# Altium footprint library EG4S20BG256.PcbLib: 33 footprints (part 2 of 3)
Each footprint in its own frame and in the unit in brackets; x right, y up, seen from the top. Pads: shape width x height; smd on the part's side, far side on the other; paste and mask are expansions set on the pad; w line width, h text height; cw(c..) or ccw(c..) is an arc to the next point about the centre after c.
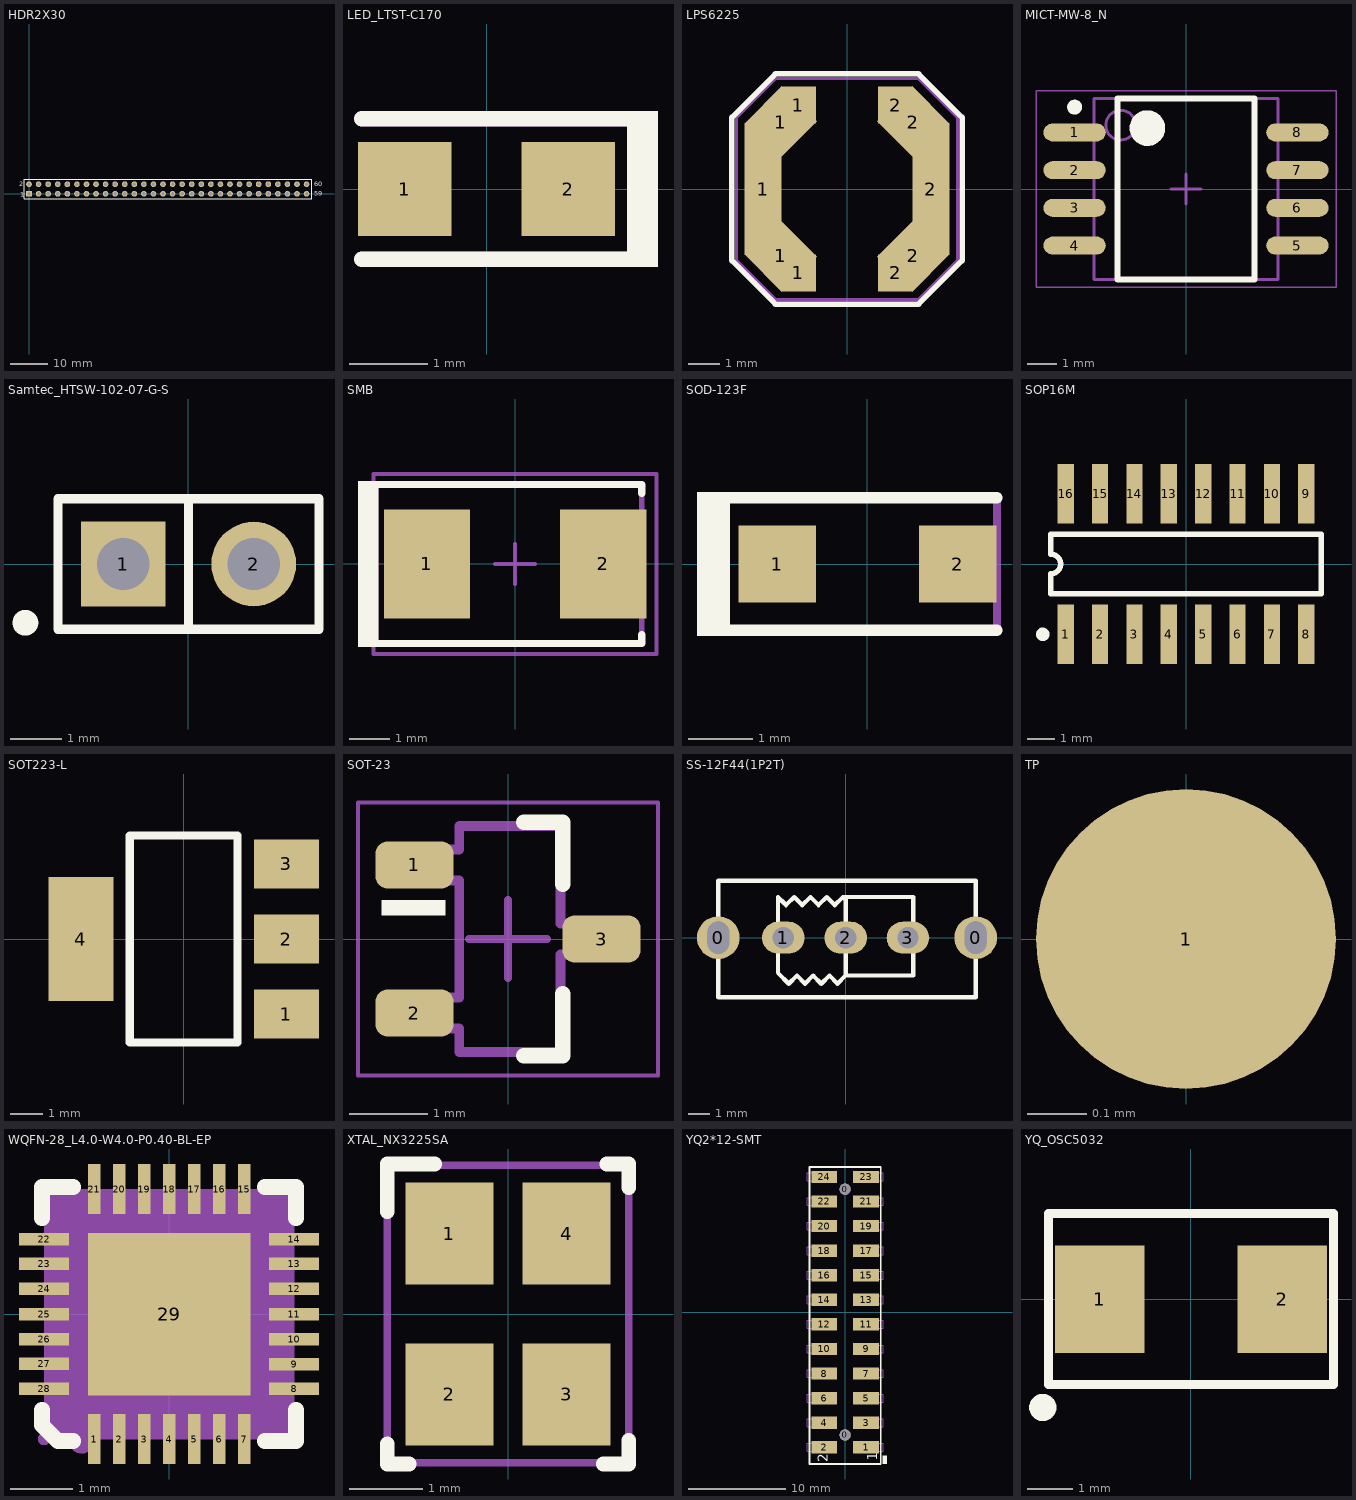
[diagram p1: the footprints below, top view; thin cyan lines are the x and y axes]

## HDR2X30 [mm] "Connector; Header; 30x2 Position"
height 5.563
pads (60):
  rect 1.5x1.5 hole 0.9: 1(0,0)
  round 1.5 hole 0.9: 2(0,2.54) 3(2.54,0) 4(2.54,2.54) 5(5.08,0) 6(5.08,2.54) 7(7.62,0) 8(7.62,2.54) 9(10.16,0) 10(10.16,2.54) 11(12.7,0) 12(12.7,2.54) 13(15.24,0) 14(15.24,2.54) 15(17.78,0) 16(17.78,2.54) 17(20.32,0) 18(20.32,2.54) 19(22.86,0) 20(22.86,2.54) 21(25.4,0) 22(25.4,2.54) 23(27.94,0) 24(27.94,2.54) 25(30.48,0) 26(30.48,2.54) 27(33.02,0) 28(33.02,2.54) 29(35.56,0) 30(35.56,2.54) 31(38.1,0) 32(38.1,2.54) 33(40.64,0) 34(40.64,2.54) 35(43.18,0) 36(43.18,2.54) 37(45.72,0) 38(45.72,2.54) 39(48.26,0) 40(48.26,2.54) 41(50.8,0) 42(50.8,2.54) 43(53.34,0) 44(53.34,2.54) 45(55.88,0) 46(55.88,2.54) 47(58.42,0) 48(58.42,2.54) 49(60.96,0) 50(60.96,2.54) 51(63.5,0) 52(63.5,2.54) 53(66.04,0) 54(66.04,2.54) 55(68.58,0) 56(68.58,2.54) 57(71.12,0) 58(71.12,2.54) 59(73.66,0) 60(73.66,2.54)
Top Overlay:
  lines w0.2: -1.27,-1.27 -1.27,3.81 75.06,3.81 75.06,-1.27 -1.27,-1.27
  text "2" at -2.665,2.03 h1.27
  text "1" at -2.327,-0.749 h1.27
  text "59" at 75.692,-0.508 h1.27
  text "60" at 75.692,2.032 h1.27

## LED_LTST-C170 [mm] "LITE-ON"
height 1.1
pads (2):
  rect 1.2x1.2 smd: 1(-1.05,0) 2(1.05,0)
Top Overlay:
  rectangle: 1.8,-1 2.2,1
  lines w0.2: -1.6,-0.9 2.1,-0.9 ; -1.6,0.9 2.1,0.9
Mechanical 5:
  rectangle: 1.8,-1 2.2,1
  lines w0.2: -1.6,-0.9 2.1,-0.9 ; -1.6,0.9 2.1,0.9
  text ".Designator" at -1.4,-0.4 h0.76
3D body: height 1.1, standoff 0.5, extent -0.699,-0.624 0.699,0.624
3D body: height 0.5, standoff 0, extent -1.05,-0.675 1.05,0.675

## LPS6225 [mm] "Coilcraft recommended land pattern.  Document 554-2, rev 10/6/08"
height 2.5
pads (10):
  rect 1.2x4.25 smd: 1(-2.7,0) 2(2.7,0)
  rect 1.68x1.6 smd rot 135: 1(-2.126,-2.151) 2(2.126,2.151)
  rect 1.68x1.6 smd rot 45: 1(-2.126,2.151) 2(2.126,-2.151)
  rect 1.125x1.2 smd: 1(-1.562,-2.7) 1(-1.562,2.7) 2(1.562,-2.7) 2(1.562,2.7)
Top Overlay:
  lines w0.178: -3.7,-2.3 -3.7,0 -3.7,2.3 -2.3,3.7 0,3.7 2.3,3.7 3.7,2.3 3.7,0 3.7,-2.3 2.3,-3.7 0,-3.7 -2.3,-3.7 -3.7,-2.3
Mechanical 5:
  lines w0.102: -3.556,-2.286 -2.286,-3.556 2.286,-3.556 3.556,-2.286 3.556,2.286 2.286,3.556 -2.286,3.556 -3.556,2.286 -3.556,-2.286
  text ".Designator" at -1.75,-0.55 h1.02
3D body "LPS6225.STEP": height 2.52, standoff 0.02, extent -3.103,-3.103 3.103,3.103

## MICT-MW-8_N [mm] "SOIC, 8-Leads, Body 6.2x6.1mm, Pitch 1.27mm, IPC Medium Density"
height 5.563
pads (8):
  oval 2.1x0.6 smd: 1(-3.75,1.905) 2(-3.75,0.635) 3(-3.75,-0.635) 4(-3.75,-1.905) 5(3.75,-1.905) 6(3.75,-0.635) 7(3.75,0.635) 8(3.75,1.905)
Top Overlay:
  circle w0.6: c-1.3,2.05 r0.3
  circle w0.25: c-3.75,2.755 r0.125
  lines w0.2: -2.3,-3.05 2.3,-3.05 2.3,3.05 -2.3,3.05 -2.3,-3.05
Mechanical 13:
  circle w0.1: c-2.2,2.15 r0.5
  lines w0.1: -3.1,-3.05 3.1,-3.05 3.1,3.05 -3.1,3.05 -3.1,-3.05
Mechanical 15:
  lines w0.05: -5.05,-3.3 5.05,-3.3 5.05,3.3 -5.05,3.3 -5.05,-3.3
  lines w0.1: -0.5,0 0.5,0 ; 0,-0.5 0,0.5
3D body: height 0, standoff 0, extent -3.1,-3.05 3.1,3.05

## Samtec_HTSW-102-07-G-S [mm] "Samtec 100mil, 1x2, 230 mil above insulator"
height 8.382
pads (2):
  rect 1.65x1.65 hole 1.016 mask+0: 1(-1.27,0)
  round 1.65 hole 1.016 mask+0: 2(1.27,0)
Top Overlay:
  circle w0.25: c-3.173,-1.143 r0.125
  lines w0.178: 0,-1.27 0,1.27 ; -2.54,-1.27 -2.54,1.27 2.54,1.27 2.54,-1.27 -2.54,-1.27
Mechanical 5:
  rectangle: -1.778,-0.508 -0.762,0.508
  lines w0.127: -2.54,-1.27 2.54,-1.27 2.54,1.27 -2.54,1.27 -2.54,-1.27
  text ".Designator" at -0.889,-0.508 h0.86
3D body: height 8.38, standoff -2.03, extent 0.953,-0.317 1.587,0.317
3D body: height 8.38, standoff -2.03, extent -1.587,-0.317 -0.953,0.317
3D body: height 2.54, standoff 0, extent -2.539,-1.269 2.539,1.269

## SMB [mm] "Molded Diode, 2-Leads, Body 5.4x3.6mm, IPC Medium Density, based on OnSemi component dimensions"
height 2.45
pads (2):
  rect 2.159x2.743 smd: 1(-2.21,0) 2(2.21,0)
Top Overlay:
  rectangle: -3.937,-2.083 -3.429,2.083
  lines w0.178: -3.607,-1.994 3.175,-1.994 3.175,-1.765 ; -3.607,1.994 3.175,1.994 3.175,1.765
Mechanical 5:
  rectangle: -3.937,-2.083 -3.429,2.083
  lines w0.127: -3.607,-1.994 3.175,-1.994 3.175,-1.765 3.175,1.765 3.175,1.994 -3.607,1.994
  text ".Designator" at -2.311,-0.508 h1.02
Mechanical 15:
  lines w0.1: -0.5,0 0.5,0 ; 0,-0.5 0,0.5 ; -3.55,-2.25 3.55,-2.25 3.55,2.25 -3.55,2.25 -3.55,-2.25
3D body "SMB_nominal.stp": height 2.32, standoff 0.02, extent -2.7,-1.8 2.7,1.8

## SOD-123F [mm] "NXP recommended land pattern"
height 1.2
pads (2):
  rect 1.2x1.2 smd paste-0.05: 1(-1.4,0) 2(1.4,0)
Top Overlay:
  rectangle: -2.642,-1.117 -2.134,1.118
  lines w0.178: -2.311,-1.029 2.007,-1.029 ; -2.311,1.029 2.007,1.029
Mechanical 5:
  rectangle: -2.642,-1.117 -2.134,1.118
  lines w0.127: -2.311,-1.029 2.007,-1.029 2.007,1.029 -2.311,1.029
  text ".Designator" at -1.778,-0.254 h0.76
3D body "SOD123F.stp": height 1.2, standoff 0, extent -1.8,-0.85 1.8,0.85

## SOP16M [mm]
height 5.563
pads (16):
  rect 0.6x2.2 smd: 1(-4.445,-2.6) 2(-3.175,-2.6) 3(-1.905,-2.6) 4(-0.635,-2.6) 5(0.635,-2.6) 6(1.905,-2.6) 7(3.175,-2.6) 8(4.445,-2.6) 9(4.445,2.6) 10(3.175,2.6) 11(1.905,2.6) 12(0.635,2.6) 13(-0.635,2.6) 14(-1.905,2.6) 15(-3.175,2.6) 16(-4.445,2.6)
Top Overlay:
  circle w0.25: c-5.295,-2.6 r0.125
  lines w0.2: -5,-1.1 -5,-0.367 ccw(c-5,0) -5,0.367 -5,1.1 5,1.1 5,-1.1 -5,-1.1

## SOT223-L [mm]
height 5.563
pads (4):
  rect 2x1.5 smd: 1(3.15,-2.3) 2(3.15,0) 3(3.15,2.3)
  rect 2x3.8 smd: 4(-3.15,0)
Top Overlay:
  lines w0.254: -1.651,-3.175 1.651,-3.175 1.651,3.175 -1.651,3.175 -1.651,-3.175

## SOT-23 [mm] "SOT23, 3-Leads, Body 2.9x1.3mm, Pitch 0.95mm, Lead Span 2.5mm, IPC Medium Density"
height 1.1
pads (3):
  rrect50% 1x0.6 smd: 1(-1.2,0.95) 2(-1.2,-0.95) 3(1.2,0)
Top Overlay:
  rectangle: -1.625,0.3 -0.8,0.5
  lines w0.2: 0.2,-1.5 0.7,-1.5 0.7,-0.7 ; 0.2,1.5 0.7,1.5 0.7,0.7
Mechanical 5:
  lines w0.127: -1.16,-1.15 -0.625,-1.15 -0.625,-1.45 0.675,-1.45 0.675,-0.2 1.21,-0.2 1.21,0.2 0.675,0.2 0.675,1.45 -0.625,1.45 -0.625,1.15 -1.16,1.15 -1.16,0.75 -0.625,0.75 -0.625,-0.75 -1.16,-0.75 -1.16,-1.15
  text ".Designator" at -0.175,1.225 h0.64
Mechanical 15:
  lines w0.05: -1.925,-1.75 -1.925,1.75 1.925,1.75 1.925,-1.75 -1.925,-1.75
  lines w0.1: -0.5,0 0.5,0 ; 0,-0.5 0,0.5
3D body "SW3dPS-sot-3p290x130ll237h100.STEP": height 1, standoff 0, extent -1.16,-1.45 1.21,1.45

## SS-12F44(1P2T) [mm]
height 5.563
pads (5):
  round 2 hole 1.016 slot 1.524 at 90 deg: 0(-5.969,0) 0(6.096,0)
  oval 2x1.5 hole 1: 1(-2.921,0) 2(0,0) 3(2.921,0)
Top Overlay:
  lines w0.2: -2.857,1.587 -3.175,1.905 -3.175,-1.651 -2.667,-2.159 -2.286,-1.778 -1.905,-2.159 -1.524,-1.778 -1.143,-2.159 -0.762,-1.778 -0.381,-2.159 0,-1.778 ; -2.794,1.524 -2.413,1.905 -2.032,1.524 -1.651,1.905 -1.27,1.524 -0.889,1.905 -0.508,1.524 -0.127,1.905 ; -0.127,1.905 0,1.778 0,-1.778 ; -0.127,1.905 3.175,1.905 3.175,1.651 3.175,-1.778 0,-1.778 ; -5.969,-2.794 6.096,-2.794 6.096,2.667 -5.969,2.667 -5.969,-2.794

## TP [mil] "test point"
height 219
pads (1):
  round 20 smd mask+2: 1(0,0)

## WQFN-28_L4.0-W4.0-P0.40-BL-EP [mm]
height 5.563
pads (29):
  rect 0.2x0.8 smd: 1(-1.2,-2) 2(-0.8,-2) 3(-0.4,-2) 4(0,-2) 5(0.4,-2) 6(0.8,-2) 7(1.2,-2) 15(1.2,2) 16(0.8,2) 17(0.4,2) 18(0,2) 19(-0.4,2) 20(-0.8,2) 21(-1.2,2)
  rect 0.8x0.2 smd: 8(2,-1.2) 9(2,-0.8) 10(2,-0.4) 11(2,0) 12(2,0.4) 13(2,0.8) 14(2,1.2) 22(-2,1.2) 23(-2,0.8) 24(-2,0.4) 25(-2,0) 26(-2,-0.4) 27(-2,-0.8) 28(-2,-1.2)
  rect 2.6x2.6 smd: 29(0,0)
Top Overlay:
  lines w0.254: -2.032,-1.531 -2.032,-1.778 -1.778,-2.032 -1.531,-2.032 ; -2.032,1.531 -2.032,2.032 -1.531,2.032 -1.651,2.032 ; 1.531,-2.032 2.032,-2.032 2.032,-1.531 ; 1.531,2.032 2.032,2.032 2.032,1.531
Mechanical 4:
  region: -2,2 2,2 2,-2 -2,-2
Mechanical 5:
  region: -1.3,1.3 1.3,1.3 1.3,-1.3 -1.3,-1.3
  region: -1.3,2 -1.1,2 -1.1,1.6 -1.3,1.6
  region: -0.9,2 -0.7,2 -0.7,1.6 -0.9,1.6
  region: -0.5,2 -0.3,2 -0.3,1.6 -0.5,1.6
  region: -0.1,2 0.1,2 0.1,1.6 -0.1,1.6
  region: 0.3,2 0.5,2 0.5,1.6 0.3,1.6
  region: 0.7,2 0.9,2 0.9,1.6 0.7,1.6
  region: 1.1,2 1.3,2 1.3,1.6 1.1,1.6
  region: -2,-1.3 -2,-1.1 -1.6,-1.1 -1.6,-1.3
  region: -2,-0.9 -2,-0.7 -1.6,-0.7 -1.6,-0.9
  region: -2,-0.5 -2,-0.3 -1.6,-0.3 -1.6,-0.5
  region: -2,-0.1 -2,0.1 -1.6,0.1 -1.6,-0.1
  region: -2,0.3 -2,0.5 -1.6,0.5 -1.6,0.3
  region: -2,0.7 -2,0.9 -1.6,0.9 -1.6,0.7
  region: -2,1.1 -2,1.3 -1.6,1.3 -1.6,1.1
  region: 1.3,-2 1.1,-2 1.1,-1.6 1.3,-1.6
  region: 0.9,-2 0.7,-2 0.7,-1.6 0.9,-1.6
  region: 0.5,-2 0.3,-2 0.3,-1.6 0.5,-1.6
  region: 0.1,-2 -0.1,-2 -0.1,-1.6 0.1,-1.6
  region: -0.3,-2 -0.5,-2 -0.5,-1.6 -0.3,-1.6
  region: -0.7,-2 -0.9,-2 -0.9,-1.6 -0.7,-1.6
  region: -1.1,-2 -1.3,-2 -1.3,-1.6 -1.1,-1.6
  region: 2,1.3 2,1.1 1.6,1.1 1.6,1.3
  region: 2,0.9 2,0.7 1.6,0.7 1.6,0.9
  region: 2,0.5 2,0.3 1.6,0.3 1.6,0.5
  region: 2,0.1 2,-0.1 1.6,-0.1 1.6,0.1
  region: 2,-0.3 2,-0.5 1.6,-0.5 1.6,-0.3
  region: 2,-0.7 2,-0.9 1.6,-0.9 1.6,-0.7
  region: 2,-1.1 2,-1.3 1.6,-1.3 1.6,-1.1
Mechanical 6:
  circle w0.1: c-2,-2 r0.05
Mechanical 15:
  circle w0.2: c-1.397,-2.032 r0.1

## XTAL_NX3225SA [mm] "NDK NX3225SA recommended land pattern"
height 0.7
pads (4):
  rect 1.2x1.4 smd: 1(-0.8,1.1) 2(-0.8,-1.1) 3(0.8,-1.1) 4(0.8,1.1)
Top Overlay:
  lines w0.2: -1.65,-1.775 -1.65,-2.05 -1.35,-2.05 ; -1.65,1.4 -1.65,2.05 -1,2.05 ; 1.3,-2.05 1.65,-2.05 1.65,-1.725 ; 1.35,2.05 1.65,2.05 1.65,1.725
Mechanical 5:
  circle w0.254: c-1.016,1.143 r0.127
  lines w0.102: -1.651,-2.032 -1.651,2.032 1.651,2.032 1.651,-2.032 -1.651,-2.032
  text ".Designator" at -0.127,1.778 h1.02
3D body "NDK_NX3225SA.stp": height 0.7, standoff 0, extent -1.3,-1.65 1.3,1.65

## YQ2*12-SMT [mil] "with location hole"
height 219
pads (26):
  round 45.28 hole 45.28: 0(0,-500) 0(0,500)
  rect 105x50 smd: 1(85,-550) 2(-85,-550) 3(85,-450) 4(-85,-450) 5(85,-350) 6(-85,-350) 7(85,-250) 8(-85,-250) 9(85,-150) 10(-85,-150) 11(85,-50) 12(-85,-50) 13(85,50) 14(-85,50) 15(85,150) 16(-85,150) 17(85,250) 18(-85,250) 19(85,350) 20(-85,350) 21(85,450) 22(-85,450) 23(85,550) 24(-85,550)
Top Overlay:
  region: 170,-616.5 152,-616.5 152,-583.5 170,-583.5
  lines w7: -145,-618 -145,361 -145,590 145,590 145,361 145,-618 -145,-618
  text "2" at -70,-610 h40
  text "1" at 130,-605 h40
Mechanical 5:
  lines w5: -97.5,-566 -155,-566 -155,-534 -97.5,-534 ; -97.5,-466 -155,-466 -155,-434 -97.5,-434 ; -97.5,-366 -155,-366 -155,-334 -97.5,-334 ; -97.5,-266 -155,-266 -155,-234 -97.5,-234 ; -97.5,-166 -155,-166 -155,-134 -97.5,-134 ; -97.5,-66 -155,-66 -155,-34 -97.5,-34 ; -97.5,34 -155,34 -155,66 -97.5,66 ; -97.5,134 -155,134 -155,166 -97.5,166 ; -97.5,234 -155,234 -155,266 -97.5,266 ; -97.5,334 -155,334 -155,366 -97.5,366 ; -97.5,434 -155,434 -155,466 -97.5,466 ; -97.5,534 -155,534 -155,566 -97.5,566 ; 97.5,-566 155,-566 155,-534 97.5,-534 ; 97.5,-466 155,-466 155,-434 97.5,-434 ; 97.5,-366 155,-366 155,-334 97.5,-334 ; 97.5,-266 155,-266 155,-234 97.5,-234 ; 97.5,-166 155,-166 155,-134 97.5,-134 ; 97.5,-66 155,-66 155,-34 97.5,-34 ; 97.5,34 155,34 155,66 97.5,66 ; 97.5,134 155,134 155,166 97.5,166 ; 97.5,234 155,234 155,266 97.5,266 ; 97.5,334 155,334 155,366 97.5,366 ; 97.5,434 155,434 155,466 97.5,466 ; 97.5,534 155,534 155,566 97.5,566
  text "2" at 122,-580 h40
  text "1" at -153,-592 h40

## YQ_OSC5032 [mm]
height 5.563
pads (2):
  rect 2x2.4 smd: 1(-2.032,0) 2(2.032,0)
Top Overlay:
  circle w0.305: c-3.302,-2.413 r0.152
  lines w0.2: -3.175,-1.905 -3.175,1.905 3.175,1.905 3.175,-1.905 -3.175,-1.905